# Altium footprint library my_pcb_lib.PcbLib: 26 footprints (part 2 of 2)
Each footprint in its own frame and in the unit in brackets; x right, y up, seen from the top. Pads: shape width x height; smd on the part's side, far side on the other; paste and mask are expansions set on the pad; w line width, h text height; cw(c..) or ccw(c..) is an arc to the next point about the centre after c.
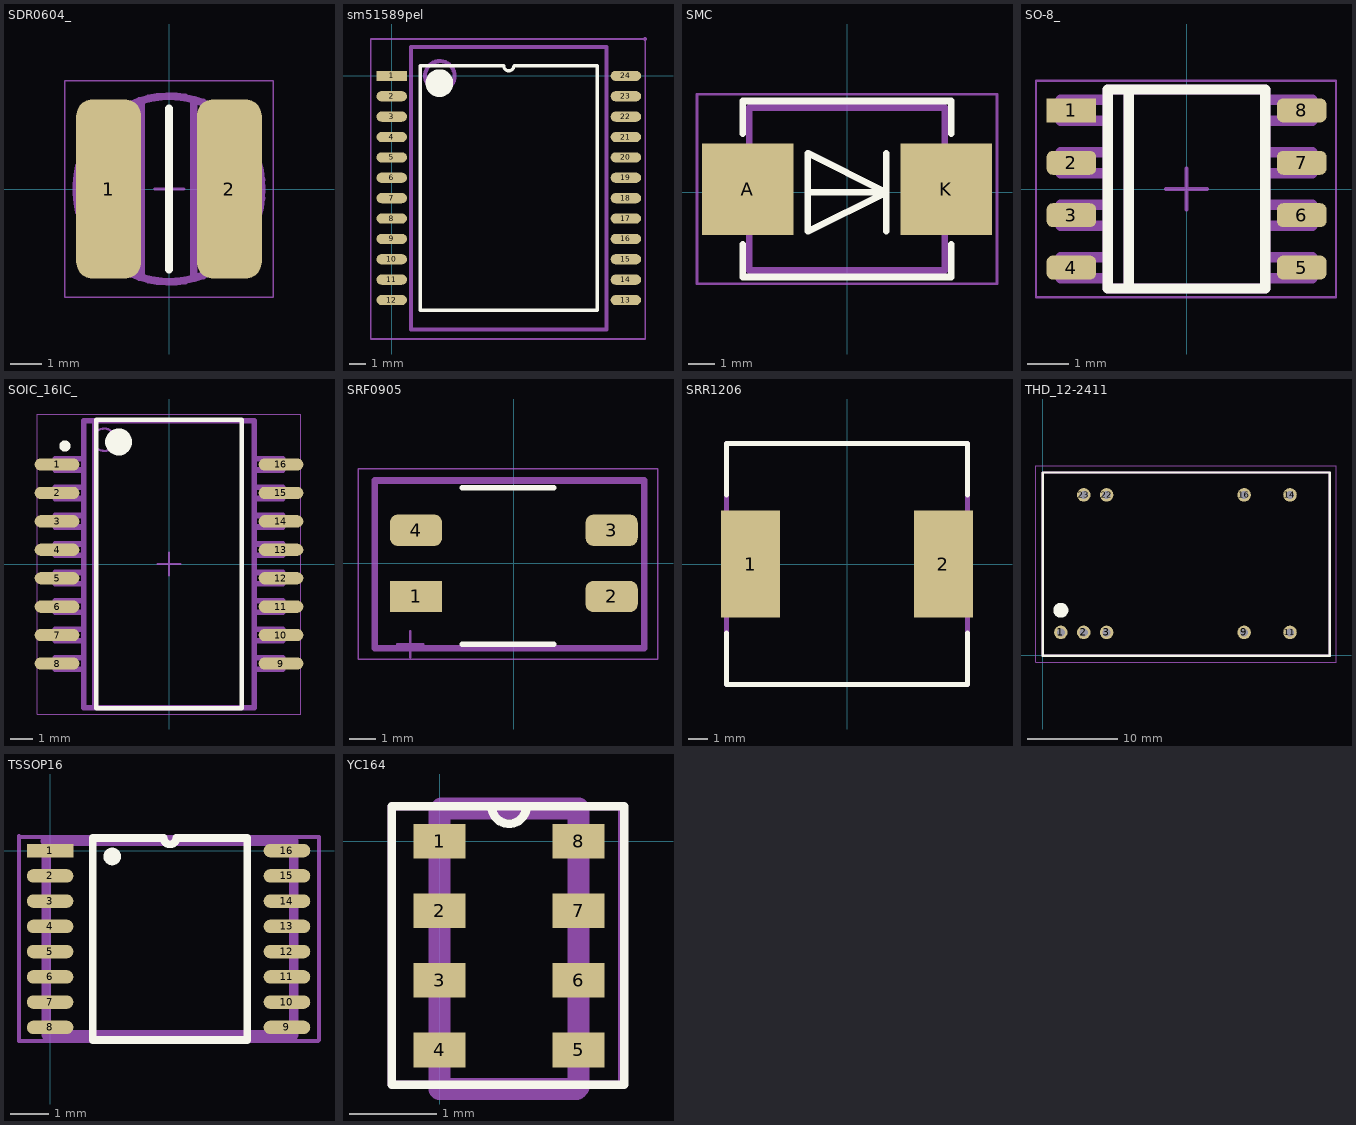
[diagram p1: the footprints below, top view; thin cyan lines are the x and y axes]

## SDR0604_ [mm]
height 4.8
pads (2):
  rrect50% 2.1x5.8 smd: 1(-1.95,0) 2(1.95,0)
Top Overlay:
  lines w0.254: 0,-2.6 0,2.6
Mechanical 3:
  circle w0.254: c0,0 r3
  lines w0.254: -0.9,-2.8 -0.9,2.8 ; 0.8,-2.8 0.8,2.8
Mechanical 13:
  circle w0.1: c0.012,0 r3.019
Mechanical 15:
  lines w0.05: -3.375,-3.5 -3.375,3.5 3.375,3.5 3.375,-3.5 -3.375,-3.5
  lines w0.1: -0.462,0 0.488,0 ; 0.013,-0.475 0.013,0.475
3D body "69540.stp": height 4.8, standoff 0, extent -2.925,-2.8 2.875,3

## sm51589pel [mm]
pads (24):
  rect 1.9x0.64 smd: 1(0,0)
  oval 1.9x0.64 smd: 2(0,-1.27) 3(0,-2.54) 4(0,-3.81) 5(0,-5.08) 6(0,-6.35) 7(0,-7.62) 8(0,-8.89) 9(0,-10.16) 10(0,-11.43) 11(0,-12.7) 12(0,-13.97) 13(14.6,-13.97) 14(14.6,-12.7) 15(14.6,-11.43) 16(14.6,-10.16) 17(14.6,-8.89) 18(14.6,-7.62) 19(14.6,-6.35) 20(14.6,-5.08) 21(14.6,-3.81) 22(14.6,-2.54) 23(14.6,-1.27) 24(14.6,0)
Top Overlay:
  circle w1: c2.975,-0.45 r0.361
  lines w0.2: 1.785,-14.605 1.785,0.635 6.982,0.635 ccw(c7.3,0.635) 7.617,0.635 12.815,0.635 12.815,-14.605 1.785,-14.605
Mechanical 11:
  lines w0.254: 1.2,-15.8 13.4,-15.8 13.4,1.8 1.2,1.8 1.2,-15.8
Mechanical 13:
  circle w0.254: c3,0 r0.922
  lines w0.1: 1.2,-15.8 13.4,-15.8 13.4,1.8 1.2,1.8 1.2,-15.8
Mechanical 15:
  region: -1.3,2.3
  lines w0.1: -1.3,-16.4 -1.3,2.3 15.8,2.3 15.8,-16.4 -1.3,-16.4
  lines w0.254: 15.8,2.3 15.8,2.3
3D body: height 6, standoff 0.25, extent 1.2,-15.8 13.4,1.8

## SMC [mm]
pads (2):
  rect 3.5x3.5 smd: A(-3.809,0.11) K(3.809,0.11)
Top Overlay:
  lines w0.254: -4,-2 -4,-3.25 4,-3.25 4,-2 ; -4,2.25 -4,3.5 4,3.5 4,2.25 ; -1.5,0 1.5,0 ; 1.5,-1.5 1.5,1.5 ; 1.5,0 -1.5,-1.5 -1.5,1.5 1.5,0
Mechanical 11:
  lines w0.254: -3.75,-3 -3.75,3.25 3.75,3.25 3.75,-3 -3.75,-3
Mechanical 13:
  lines w0.1: -3.809,-3 -3.809,3.22 3.809,3.22 3.809,-3 -3.809,-3
Mechanical 15:
  lines w0.1: -5.75,-3.5 -5.75,3.75 5.75,3.75 5.75,-3.5 -5.75,-3.5
3D body "SW3DPS-SMC-DEFAULT.STEP": height 2.8, standoff 0, extent -3.809,-3 3.809,3.22

## SO-8_ [mm]
height 1.75
pads (8):
  rect 1.2x0.58 smd: 1(-2.794,1.905)
  rrect50% 1.2x0.58 smd: 2(-2.794,0.635) 3(-2.794,-0.635) 4(-2.794,-1.905) 5(2.794,-1.905) 6(2.794,-0.635) 7(2.794,0.635) 8(2.794,1.905)
Top Overlay:
  lines w0.254: -1.397,-2.413 -1.397,2.413 ; -1.905,-2.413 1.905,-2.413 1.905,2.413 -1.905,2.413 -1.905,-2.413
Mechanical 3:
  lines w0.254: -1.905,-2.159 -3.048,-2.159 -3.048,-1.651 -1.905,-1.651 ; -1.905,-0.889 -3.048,-0.889 -3.048,-0.381 -1.905,-0.381 ; -1.905,0.381 -3.048,0.381 -3.048,0.889 -1.905,0.889 ; -1.905,1.651 -3.048,1.651 -3.048,2.159 -1.905,2.159 ; -1.397,-2.413 -1.397,2.413 ; 1.905,-2.159 3.048,-2.159 3.048,-1.651 1.905,-1.651 ; 1.905,-0.889 3.048,-0.889 3.048,-0.381 1.905,-0.381 ; 1.905,0.381 3.048,0.381 3.048,0.889 1.905,0.889 ; 1.905,1.651 3.048,1.651 3.048,2.159 1.905,2.159 ; -1.905,-2.413 -1.905,2.413 1.905,2.413 1.905,-2.413 -1.905,-2.413
Mechanical 13:
  lines w0.1: -1.905,-2.413 1.905,-2.413 1.905,2.413 -1.905,2.413 -1.905,-2.413
Mechanical 15:
  lines w0.05: -3.65,-2.625 -3.65,2.625 3.625,2.625 3.625,-2.625 -3.65,-2.625
  lines w0.1: -0.5,0 0.5,0 ; 0,-0.5 0,0.5
3D body "SW3DPS-SO-8-DEFAULT.STEP": height 1.45, standoff 0, extent -2.889,-2.402 2.889,2.5

## SOIC_16IC_ [mm] "D?"
height 2.64
pads (16):
  oval 2x0.55 smd: 1(-5,4.445) 2(-5,3.175) 3(-5,1.905) 4(-5,0.635) 5(-5,-0.635) 6(-5,-1.905) 7(-5,-3.175) 8(-5,-4.445) 9(5,-4.445) 10(5,-3.175) 11(5,-1.905) 12(5,-0.635) 13(5,0.635) 14(5,1.905) 15(5,3.175) 16(5,4.445)
Top Overlay:
  circle w0.6: c-2.25,5.45 r0.3
  circle w0.25: c-4.65,5.27 r0.125
  lines w0.2: -3.25,-6.45 3.25,-6.45 3.25,6.45 -3.25,6.45 -3.25,-6.45
Mechanical 3:
  lines w0.254: -3.81,-4.695 -5.08,-4.695 -5.08,-4.187 -3.81,-4.187 ; -3.81,-3.425 -5.08,-3.425 -5.08,-2.917 -3.81,-2.917 ; -3.81,-2.155 -5.08,-2.155 -5.08,-1.647 -3.81,-1.647 ; -3.81,-0.885 -5.08,-0.885 -5.08,-0.377 -3.81,-0.377 ; -3.81,0.385 -5.08,0.385 -5.08,0.893 -3.81,0.893 ; -3.81,1.655 -5.08,1.655 -5.08,2.163 -3.81,2.163 ; -3.81,2.925 -5.08,2.925 -5.08,3.433 -3.81,3.433 ; -3.81,4.195 -5.08,4.195 -5.08,4.703 -3.81,4.703 ; -3.302,-6.4 -3.302,6.4 ; 3.81,-4.695 5.08,-4.695 5.08,-4.187 3.81,-4.187 ; 3.81,-3.425 5.08,-3.425 5.08,-2.917 3.81,-2.917 ; 3.81,-2.155 5.08,-2.155 5.08,-1.647 3.81,-1.647 ; 3.81,-0.885 5.08,-0.885 5.08,-0.377 3.81,-0.377 ; 3.81,0.385 5.08,0.385 5.08,0.893 3.81,0.893 ; 3.81,1.655 5.08,1.655 5.08,2.163 3.81,2.163 ; 3.81,2.925 5.08,2.925 5.08,3.433 3.81,3.433 ; 3.81,4.195 5.08,4.195 5.08,4.703 3.81,4.703 ; -3.81,-6.425 -3.81,6.4 -0.716,6.4 3.094,6.4 3.81,6.4 3.81,-6.425 -3.81,-6.425
Mechanical 11:
  lines w0.05: -5.875,-6.7 5.875,-6.7 5.875,6.7 -5.875,6.7 -5.875,-6.7
  lines w0.1: -0.5,0 0.5,0 ; 0,-0.5 0,0.5
Mechanical 13:
  circle w0.1: c-2.9,5.55 r0.5
  lines w0.1: -3.8,-6.45 3.8,-6.45 3.8,6.45 -3.8,6.45 -3.8,-6.45
3D body "User Library-SOIC16_Wide_JEDEC_MS-013AA.step": height 2.72, standoff 0.07, extent -5.29,-5.25 5.34,5.25
3D body: height 2.64, standoff 0.23, extent -3.8,-6.45 3.8,6.45

## SRF0905 [mm] "Inductor, 4-Leads"
height 6.5
pads (4):
  rect 2x1.2 smd: 1(-3.75,-1.27)
  rrect50% 2x1.2 smd: 2(3.75,-1.27) 3(3.75,1.27) 4(-3.75,1.27)
Top Overlay:
  lines w0.2: -1.975,-3.1 1.525,-3.1 ; -1.975,2.9 1.525,2.9
Mechanical 3:
  lines w0.254: -5.335,-3.25 5.005,-3.25 5.005,3.175 -5.335,3.175 -5.335,-3.25
Mechanical 13:
  lines w0.1: -5.335,-3.225 5.005,-3.225 5.005,3.175 -5.335,3.175 -5.335,-3.225
Mechanical 15:
  lines w0.05: -5.975,-3.675 5.525,-3.675 5.525,3.625 -5.975,3.625 -5.975,-3.675
  lines w0.1: -4.475,-3.1 -3.475,-3.1 ; -3.975,-3.6 -3.975,-2.6
3D body "User Library-Bourns - SRF0905.step": height 5, standoff 0, extent -4.6,-3 4.6,3

## SRR1206 [mm]
pads (2):
  rect 3.1x5.6 smd: 1(-5.05,0) 2(5.05,0)
Top Overlay:
  lines w0.254: -6.3,-3.6 -6.3,-6.3 6.3,-6.3 6.3,-3.6 ; -6.3,3.6 -6.3,6.3 6.3,6.3 6.3,3.6
Mechanical 3:
  lines w0.254: -6.3,-6.3 -6.3,6.3 6.3,6.3 6.3,-6.3 -6.3,-6.3
3D body "70086.stp": height 6.55, standoff 0.05, extent -6.375,-6.35 6.325,6.35

## THD_12-2411 [mm]
pads (9):
  round 1.5 hole 0.9: 1(2,2.54) 2(4.54,2.54) 3(7.08,2.54) 9(22.32,2.54) 11(27.4,2.54) 14(27.4,17.78) 16(22.32,17.78) 22(7.08,17.78) 23(4.54,17.78)
Top Overlay:
  circle w1.254: c2,5 r0.2
  lines w0.254: 0,-0.04 0,20.26 31.8,20.26 31.8,-0.04 0,-0.04
Mechanical 3:
  lines w0.254: 0,-0.04 31.8,-0.04 31.8,20.26 0,20.26 0,-0.04
Mechanical 13:
  lines w0.1: 0,-0.04 0,20.26 31.8,20.26 31.8,-0.04 0,-0.04
Mechanical 15:
  lines w0.05: -0.75,-0.75 -0.75,21 32.5,21 32.5,-0.75 -0.75,-0.75
  lines w0.1: 4,2.5 5,2.5 ; 4.1,2.45 5.1,2.45 ; 4.5,2 4.5,3 4.5,2
3D body "thd12.stp": height 11.4, standoff -2.5, extent 0,0 31.8,20.3

## TSSOP16 [mm]
pads (16):
  rect 1.2x0.35 smd: 1(0,0)
  oval 1.2x0.35 smd: 2(0,-0.65) 3(0,-1.3) 4(0,-1.95) 5(0,-2.6) 6(0,-3.25) 7(0,-3.9) 8(0,-4.55) 9(6.1,-4.55) 10(6.1,-3.9) 11(6.1,-3.25) 12(6.1,-2.6) 13(6.1,-1.95) 14(6.1,-1.3) 15(6.1,-0.65) 16(6.1,0)
Top Overlay:
  lines w0.2: 2.9,0.325 1.1,0.325 1.1,-4.875 5.075,-4.875 5.075,0.325 3.25,0.325 cw(c3.088,0.325) 2.925,0.325
  lines w0.254: 1.697,-0.126 ccw(c1.6,-0.15) 1.7,-0.15
Mechanical 11:
  lines w0.254: -0.125,0.25 6.275,0.25 6.275,-4.75 -0.1,-4.75 -0.1,0.225
Mechanical 13:
  lines w0.1: -0.125,-4.75 6.275,-4.75 6.275,0.25 -0.125,0.25 -0.125,-4.75
Mechanical 15:
  lines w0.1: -0.8,-4.9 -0.8,0.375 -0.775,0.35 6.925,0.35 6.925,-4.875 6.9,-4.9 -0.8,-4.9
3D body "User Library-TSSOP-16-1.step": height 1.1, standoff 0, extent -0.125,-4.75 6.275,0.25

## YC164 [mm]
pads (8):
  rect 0.6x0.4 smd: 1(0,0) 2(0,-0.8) 3(0,-1.6) 4(0,-2.4) 5(1.6,-2.4) 6(1.6,-1.6) 7(1.6,-0.8) 8(1.6,0)
Top Overlay:
  lines w0.1: -0.55,-2.8 -0.55,0.4 1,0.4 cw(c0.8,0.4) 0.6,0.4 2.125,0.4 2.125,-2.8 -0.55,-2.8
Mechanical 11:
  lines w0.254: 0,-2.85 0,0.35 0.025,0.375 1.6,0.375 1.6,-2.825 1.575,-2.85 0,-2.85
Mechanical 13:
  lines w0.1: 0,-2.825 0,0.375 1.6,0.375 1.6,-2.825 0,-2.825
Mechanical 15:
  lines w0.1: -0.55,-2.8 2.1,-2.8 2.1,0.4 -0.55,0.4 -0.55,-2.8
3D body "User Library-Array-1206-4Way-Var1.STEP": height 0.5, standoff 0, extent 0,-2.825 1.6,0.375